# Altium footprint library General_Lib.PcbLib: 729 footprints (part 21 of 46)
Each footprint in its own frame and in the unit in brackets; x right, y up, seen from the top. Pads: shape width x height; smd on the part's side, far side on the other; paste and mask are expansions set on the pad; w line width, h text height; cw(c..) or ccw(c..) is an arc to the next point about the centre after c.
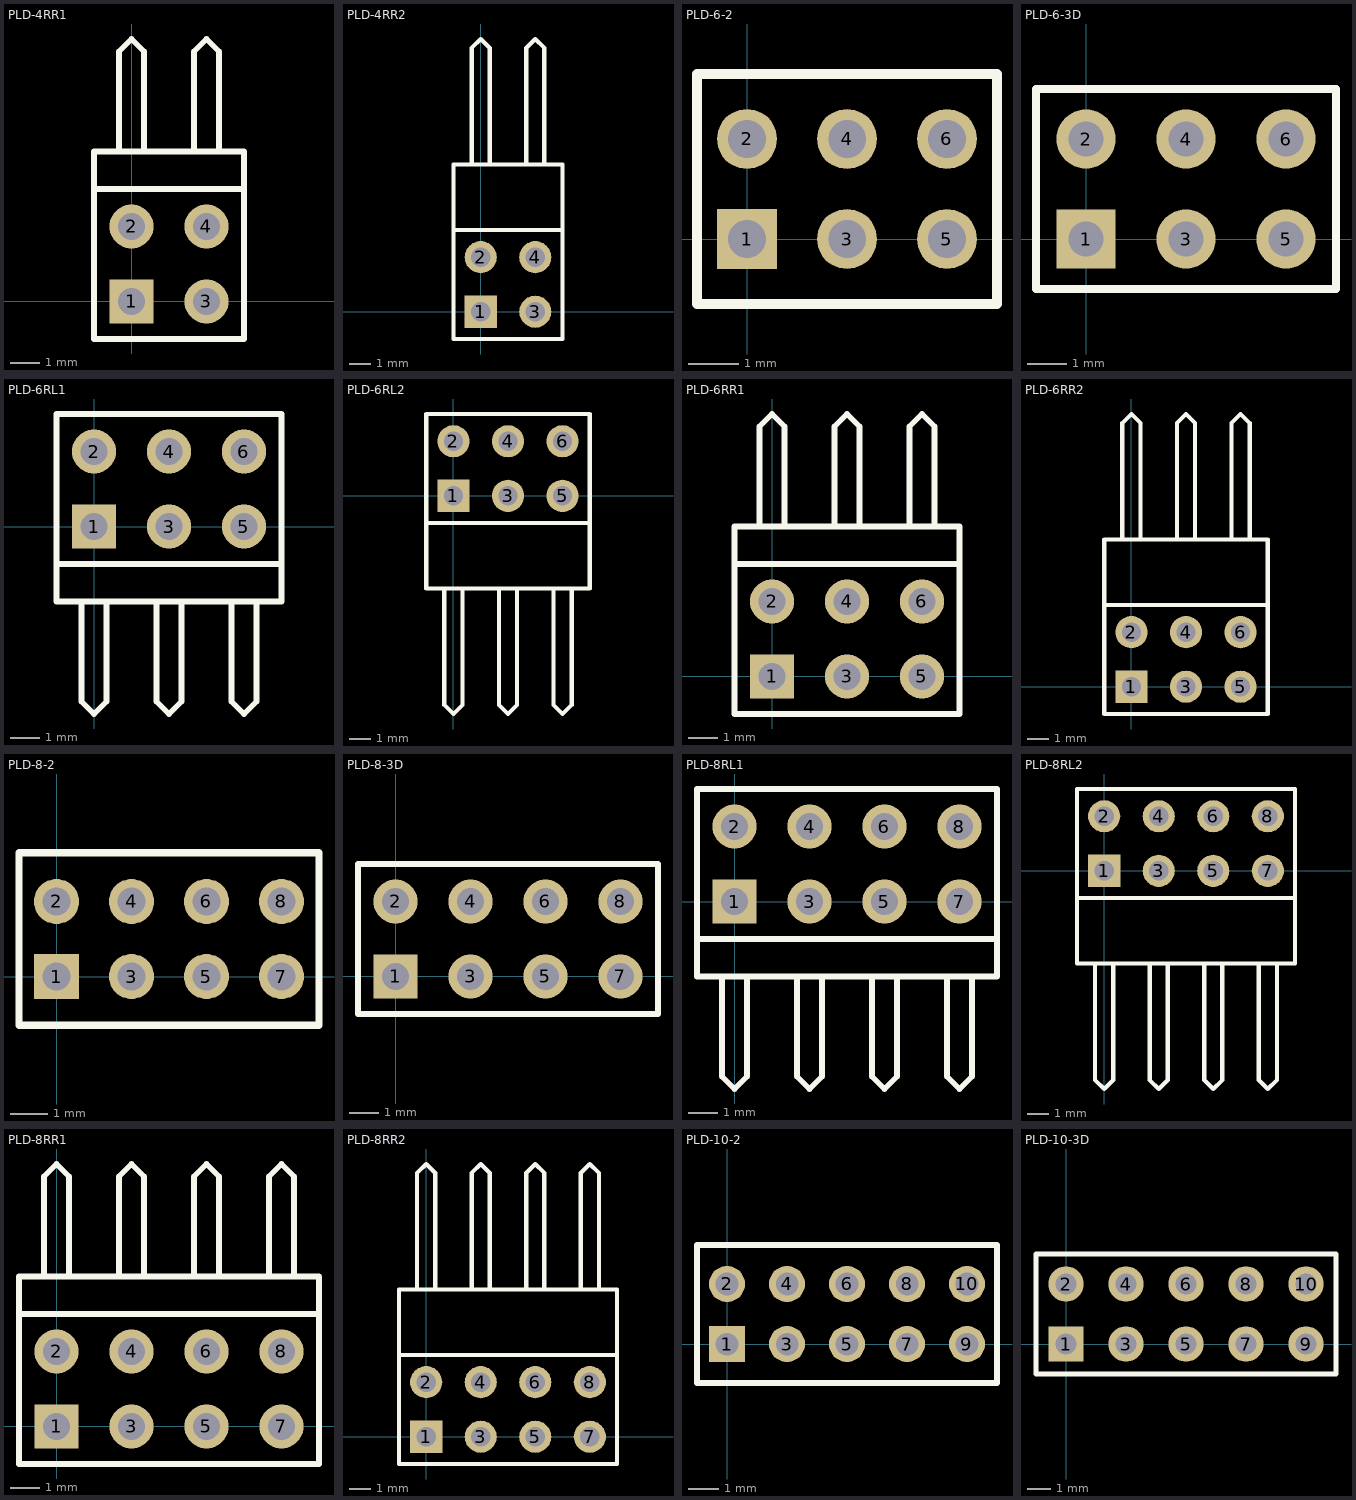
[diagram p20: the footprints below, top view; thin cyan lines are the x and y axes]

## PLD-4RR1 [mm] "Connector; Header; 2x2 Position"
height 7
pads (4):
  rect 1.5x1.5 hole 0.9: 1(0,0)
  round 1.5 hole 0.9: 2(0,2.54) 3(2.54,0) 4(2.54,2.54)
Top Overlay:
  lines w0.2: -0.423,5.08 -0.423,8.467 0,8.89 0.423,8.467 0.423,5.08 ; 2.117,5.08 2.117,8.467 2.54,8.89 2.963,8.467 2.963,5.08 ; -1.27,3.81 -1.27,-1.27 3.81,-1.27 3.81,3.81 ; -1.27,3.81 3.81,3.81 ; -1.27,3.81 -1.27,5.08 3.81,5.08 3.81,3.81
3D body "PLS-1R.step": height 5.45, standoff -3, extent -1.27,1.27 1.27,9.89
3D body "PLS-1Rr.stp": height 7.99, standoff -3, extent -1.27,-1.27 1.27,9.89
3D body "PLS-1Rr.stp": height 7.99, standoff -3, extent 1.27,-1.27 3.81,9.89
3D body "PLS-1R.step": height 5.45, standoff -3, extent 1.27,1.27 3.81,9.89

## PLD-4RR2 [mm] "Connector; Header; 2x2 Position"
height 5
pads (4):
  rect 1.5x1.5 hole 0.9: 1(0,0)
  round 1.5 hole 0.9: 2(0,2.54) 3(2.54,0) 4(2.54,2.54)
Top Overlay:
  lines w0.2: -0.423,6.858 -0.423,12.277 0,12.7 0.423,12.277 0.423,6.858 ; 2.117,6.858 2.117,12.277 2.54,12.7 2.963,12.277 2.963,6.858 ; -1.27,3.81 -1.27,6.858 3.81,6.858 3.81,3.81 ; -1.27,3.81 3.81,3.81 ; -1.27,3.81 -1.27,-1.27 3.81,-1.27 3.81,3.81
3D body "PLD-R2.stp": height 5.08, standoff -2.6, extent 1.27,-0.324 3.81,12.516
3D body "PLD-R2.stp": height 5.08, standoff -2.6, extent -1.27,-0.324 1.27,12.516

## PLD-6-2 [mm] "Connector; Header; 3x2 Position"
height 6
pads (6):
  rect 1.2x1.2 hole 0.75: 1(0,0)
  round 1.2 hole 0.75: 2(0,2) 3(2,0) 4(2,2) 5(4,0) 6(4,2)
Top Overlay:
  lines w0.2: -1,-1.3 5,-1.3 5,3.3 -1,3.3 -1,-1.3
3D body "pld-2mm.stp": height 5.5, standoff -2.5, extent -1,-1.3 1,3.3
3D body "pld-2mm.stp": height 5.5, standoff -2.5, extent 1,-1.3 3,3.3
3D body "pld-2mm.stp": height 5.5, standoff -2.5, extent 3,-1.3 5,3.3

## PLD-6-3D [mm] "Connector; Header; 3x2 Position"
height 7.5
pads (6):
  rect 1.5x1.5 hole 0.9: 1(0,0)
  round 1.5 hole 0.9: 2(0,2.54) 3(2.54,0) 4(2.54,2.54) 5(5.08,0) 6(5.08,2.54)
Top Overlay:
  lines w0.2: 1.482,-1.27 6.35,-1.27 ; 6.35,-1.27 6.35,3.81 -1.27,3.81 -1.27,-1.27 6.35,-1.27
3D body "PLD-6.step": height 8.4, standoff -3, extent -1.27,-1.23 6.35,3.77

## PLD-6RL1 [mm] "Connector; Header; 3x2 Position"
height 7
pads (6):
  rect 1.5x1.5 hole 0.9: 1(0,0)
  round 1.5 hole 0.9: 2(0,2.54) 3(2.54,0) 4(2.54,2.54) 5(5.08,0) 6(5.08,2.54)
Top Overlay:
  lines w0.2: -0.423,-2.54 -0.423,-5.927 0,-6.35 0.423,-5.927 0.423,-2.54 ; 2.117,-2.54 2.117,-5.927 2.54,-6.35 2.963,-5.927 2.963,-2.54 ; 4.657,-2.54 4.657,-5.927 5.08,-6.35 5.503,-5.927 5.503,-2.54 ; -1.27,-1.27 6.35,-1.27 ; -1.27,-1.27 -1.27,3.81 6.35,3.81 6.35,-1.27 ; -1.27,-1.27 -1.27,-2.54 6.35,-2.54 6.35,-1.27
3D body "PLS-1Rr.stp": height 7.99, standoff -3, extent -1.27,-7.35 1.27,3.81
3D body "PLS-1R.step": height 5.45, standoff -3, extent -1.27,-7.35 1.27,1.27
3D body "PLS-1R.step": height 5.45, standoff -3, extent 1.27,-7.35 3.81,1.27
3D body "PLS-1Rr.stp": height 7.99, standoff -3, extent 1.27,-7.35 3.81,3.81
3D body "PLS-1Rr.stp": height 7.99, standoff -3, extent 3.81,-7.35 6.35,3.81
3D body "PLS-1R.step": height 5.45, standoff -3, extent 3.81,-7.35 6.35,1.27

## PLD-6RL2 [mm] "Connector; Header; 3x2 Position"
height 5
pads (6):
  rect 1.5x1.5 hole 0.9: 1(0,0)
  round 1.5 hole 0.9: 2(0,2.54) 3(2.54,0) 4(2.54,2.54) 5(5.08,0) 6(5.08,2.54)
Top Overlay:
  lines w0.2: -0.423,-4.318 -0.423,-9.737 0,-10.16 0.423,-9.737 0.423,-4.318 ; 2.117,-4.318 2.117,-9.737 2.54,-10.16 2.963,-9.737 2.963,-4.318 ; 4.657,-4.318 4.657,-9.737 5.08,-10.16 5.503,-9.737 5.503,-4.318 ; -1.27,-1.27 6.35,-1.27 ; -1.27,-1.27 -1.27,3.81 6.35,3.81 6.35,-1.27 ; -1.27,-1.27 -1.27,-4.318 6.35,-4.318 6.35,-1.27
3D body "PLD-R2.stp": height 5.08, standoff -2.6, extent -1.27,-9.976 1.27,2.864
3D body "PLD-R2.stp": height 5.08, standoff -2.6, extent 1.27,-9.976 3.81,2.864
3D body "PLD-R2.stp": height 5.08, standoff -2.6, extent 3.81,-9.976 6.35,2.864

## PLD-6RR1 [mm] "Connector; Header; 3x2 Position"
height 7
pads (6):
  rect 1.5x1.5 hole 0.9: 1(0,0)
  round 1.5 hole 0.9: 2(0,2.54) 3(2.54,0) 4(2.54,2.54) 5(5.08,0) 6(5.08,2.54)
Top Overlay:
  lines w0.2: -0.423,5.08 -0.423,8.467 0,8.89 0.423,8.467 0.423,5.08 ; 2.117,5.08 2.117,8.467 2.54,8.89 2.963,8.467 2.963,5.08 ; 4.657,5.08 4.657,8.467 5.08,8.89 5.503,8.467 5.503,5.08 ; -1.27,3.81 6.35,3.81 ; -1.27,3.81 -1.27,-1.27 6.35,-1.27 6.35,3.81 ; -1.27,3.81 -1.27,5.08 6.35,5.08 6.35,3.81
3D body "PLS-1Rr.stp": height 7.99, standoff -3, extent 3.81,-1.27 6.35,9.89
3D body "PLS-1R.step": height 5.45, standoff -3, extent 3.81,1.27 6.35,9.89
3D body "PLS-1R.step": height 5.45, standoff -3, extent 1.27,1.27 3.81,9.89
3D body "PLS-1Rr.stp": height 7.99, standoff -3, extent 1.27,-1.27 3.81,9.89
3D body "PLS-1Rr.stp": height 7.99, standoff -3, extent -1.27,-1.27 1.27,9.89
3D body "PLS-1R.step": height 5.45, standoff -3, extent -1.27,1.27 1.27,9.89

## PLD-6RR2 [mm] "Connector; Header; 3x2 Position"
height 5
pads (6):
  rect 1.5x1.5 hole 0.9: 1(0,0)
  round 1.5 hole 0.9: 2(0,2.54) 3(2.54,0) 4(2.54,2.54) 5(5.08,0) 6(5.08,2.54)
Top Overlay:
  lines w0.2: -0.423,6.858 -0.423,12.277 0,12.7 0.423,12.277 0.423,6.858 ; 2.117,6.858 2.117,12.277 2.54,12.7 2.963,12.277 2.963,6.858 ; 4.657,6.858 4.657,12.277 5.08,12.7 5.503,12.277 5.503,6.858 ; -1.27,3.81 6.35,3.81 ; -1.27,3.81 -1.27,6.858 6.35,6.858 6.35,3.81 ; -1.27,3.81 -1.27,-1.27 6.35,-1.27 6.35,3.81
3D body "PLD-R2.stp": height 5.08, standoff -2.6, extent 3.81,-0.324 6.35,12.516
3D body "PLD-R2.stp": height 5.08, standoff -2.6, extent 1.27,-0.324 3.81,12.516
3D body "PLD-R2.stp": height 5.08, standoff -2.6, extent -1.27,-0.324 1.27,12.516

## PLD-8-2 [mm] "Connector; Header; 4x2 Position"
height 6
pads (8):
  rect 1.2x1.2 hole 0.75: 1(0,0)
  round 1.2 hole 0.75: 2(0,2) 3(2,0) 4(2,2) 5(4,0) 6(4,2) 7(6,0) 8(6,2)
Top Overlay:
  lines w0.2: -1,-1.3 -1,3.3 7,3.3 7,-1.3 -1,-1.3
3D body "pld-2mm.stp": height 5.5, standoff -2.5, extent 5,-1.3 7,3.3
3D body "pld-2mm.stp": height 5.5, standoff -2.5, extent 3,-1.3 5,3.3
3D body "pld-2mm.stp": height 5.5, standoff -2.5, extent 1,-1.3 3,3.3
3D body "pld-2mm.stp": height 5.5, standoff -2.5, extent -1,-1.3 1,3.3

## PLD-8-3D [mm] "Connector; Header; 4x2 Position"
height 7.5
pads (8):
  rect 1.5x1.5 hole 0.9: 1(0,0)
  round 1.5 hole 0.9: 2(0,2.54) 3(2.54,0) 4(2.54,2.54) 5(5.08,0) 6(5.08,2.54) 7(7.62,0) 8(7.62,2.54)
Top Overlay:
  lines w0.2: -1.27,-1.27 8.89,-1.27 8.89,3.81 -1.27,3.81 -1.27,-1.27
3D body "PLD-08.step": height 8.4, standoff -3, extent -1.27,-1.23 8.89,3.77

## PLD-8RL1 [mm] "Connector; Header; 4x2 Position"
height 7
pads (8):
  rect 1.5x1.5 hole 0.9: 1(0,0)
  round 1.5 hole 0.9: 2(0,2.54) 3(2.54,0) 4(2.54,2.54) 5(5.08,0) 6(5.08,2.54) 7(7.62,0) 8(7.62,2.54)
Top Overlay:
  lines w0.2: -0.423,-2.54 -0.423,-5.927 0,-6.35 0.423,-5.927 0.423,-2.54 ; 2.117,-2.54 2.117,-5.927 2.54,-6.35 2.963,-5.927 2.963,-2.54 ; 4.657,-2.54 4.657,-5.927 5.08,-6.35 5.503,-5.927 5.503,-2.54 ; 7.197,-2.54 7.197,-5.927 7.62,-6.35 8.043,-5.927 8.043,-2.54 ; -1.27,-1.27 -1.27,-2.54 8.89,-2.54 8.89,-1.27 ; -1.27,-1.27 -1.27,3.81 8.89,3.81 8.89,-1.27 ; -1.27,-1.27 8.89,-1.27
3D body "PLS-1R.step": height 5.45, standoff -3, extent 3.81,-7.35 6.35,1.27
3D body "PLS-1Rr.stp": height 7.99, standoff -3, extent 3.81,-7.35 6.35,3.81
3D body "PLS-1Rr.stp": height 7.99, standoff -3, extent 6.35,-7.35 8.89,3.81
3D body "PLS-1R.step": height 5.45, standoff -3, extent 6.35,-7.35 8.89,1.27
3D body "PLS-1R.step": height 5.45, standoff -3, extent -1.27,-7.35 1.27,1.27
3D body "PLS-1Rr.stp": height 7.99, standoff -3, extent -1.27,-7.35 1.27,3.81
3D body "PLS-1Rr.stp": height 7.99, standoff -3, extent 1.27,-7.35 3.81,3.81
3D body "PLS-1R.step": height 5.45, standoff -3, extent 1.27,-7.35 3.81,1.27

## PLD-8RL2 [mm] "Connector; Header; 4x2 Position"
height 5
pads (8):
  rect 1.5x1.5 hole 0.9: 1(0,0)
  round 1.5 hole 0.9: 2(0,2.54) 3(2.54,0) 4(2.54,2.54) 5(5.08,0) 6(5.08,2.54) 7(7.62,0) 8(7.62,2.54)
Top Overlay:
  lines w0.2: -0.423,-4.318 -0.423,-9.737 0,-10.16 0.423,-9.737 0.423,-4.318 ; 2.117,-4.318 2.117,-9.737 2.54,-10.16 2.963,-9.737 2.963,-4.318 ; 4.657,-4.318 4.657,-9.737 5.08,-10.16 5.503,-9.737 5.503,-4.318 ; 7.197,-4.318 7.197,-9.737 7.62,-10.16 8.043,-9.737 8.043,-4.318 ; 8.89,-1.27 -1.27,-1.27 ; -1.27,-1.27 -1.27,3.81 8.89,3.81 8.89,-4.318 -1.27,-4.318 -1.27,-1.27
3D body "PLD-R2.stp": height 5.08, standoff -2.6, extent 1.27,-9.976 3.81,2.864
3D body "PLD-R2.stp": height 5.08, standoff -2.6, extent -1.27,-9.976 1.27,2.864
3D body "PLD-R2.stp": height 5.08, standoff -2.6, extent 6.35,-9.976 8.89,2.864
3D body "PLD-R2.stp": height 5.08, standoff -2.6, extent 3.81,-9.976 6.35,2.864

## PLD-8RR1 [mm] "Connector; Header; 4x2 Position"
height 7
pads (8):
  rect 1.5x1.5 hole 0.9: 1(0,0)
  round 1.5 hole 0.9: 2(0,2.54) 3(2.54,0) 4(2.54,2.54) 5(5.08,0) 6(5.08,2.54) 7(7.62,0) 8(7.62,2.54)
Top Overlay:
  lines w0.2: -0.423,5.08 -0.423,8.467 0,8.89 0.423,8.467 0.423,5.08 ; 2.117,5.08 2.117,8.467 2.54,8.89 2.963,8.467 2.963,5.08 ; 4.657,5.08 4.657,8.467 5.08,8.89 5.503,8.467 5.503,5.08 ; 7.197,5.08 7.197,8.467 7.62,8.89 8.043,8.467 8.043,5.08 ; -1.27,3.81 8.89,3.81 ; -1.27,3.81 -1.27,-1.27 8.89,-1.27 8.89,3.81 ; -1.27,3.81 -1.27,5.08 8.89,5.08 8.89,3.81
3D body "PLS-1R.step": height 5.45, standoff -3, extent 3.81,1.27 6.35,9.89
3D body "PLS-1Rr.stp": height 7.99, standoff -3, extent 3.81,-1.27 6.35,9.89
3D body "PLS-1Rr.stp": height 7.99, standoff -3, extent 6.35,-1.27 8.89,9.89
3D body "PLS-1R.step": height 5.45, standoff -3, extent 6.35,1.27 8.89,9.89
3D body "PLS-1R.step": height 5.45, standoff -3, extent -1.27,1.27 1.27,9.89
3D body "PLS-1Rr.stp": height 7.99, standoff -3, extent -1.27,-1.27 1.27,9.89
3D body "PLS-1Rr.stp": height 7.99, standoff -3, extent 1.27,-1.27 3.81,9.89
3D body "PLS-1R.step": height 5.45, standoff -3, extent 1.27,1.27 3.81,9.89

## PLD-8RR2 [mm] "Connector; Header; 4x2 Position"
height 5
pads (8):
  rect 1.5x1.5 hole 0.9: 1(0,0)
  round 1.5 hole 0.9: 2(0,2.54) 3(2.54,0) 4(2.54,2.54) 5(5.08,0) 6(5.08,2.54) 7(7.62,0) 8(7.62,2.54)
Top Overlay:
  lines w0.2: -0.423,6.858 -0.423,12.277 0,12.7 0.423,12.277 0.423,6.858 ; 2.117,6.858 2.117,12.277 2.54,12.7 2.963,12.277 2.963,6.858 ; 4.657,6.858 4.657,12.277 5.08,12.7 5.503,12.277 5.503,6.858 ; 7.197,6.858 7.197,12.277 7.62,12.7 8.043,12.277 8.043,6.858 ; 8.89,3.81 -1.27,3.81 ; -1.27,3.81 -1.27,6.858 8.89,6.858 8.89,-1.27 -1.27,-1.27 -1.27,3.81
3D body "PLD-R2.stp": height 5.08, standoff -2.6, extent 3.81,-0.324 6.35,12.516
3D body "PLD-R2.stp": height 5.08, standoff -2.6, extent 6.35,-0.324 8.89,12.516
3D body "PLD-R2.stp": height 5.08, standoff -2.6, extent -1.27,-0.324 1.27,12.516
3D body "PLD-R2.stp": height 5.08, standoff -2.6, extent 1.27,-0.324 3.81,12.516

## PLD-10-2 [mm] "Connector; Header; 5x2 Position"
height 6
pads (10):
  rect 1.2x1.2 hole 0.75: 1(0,0)
  round 1.2 hole 0.75: 2(0,2) 3(2,0) 4(2,2) 5(4,0) 6(4,2) 7(6,0) 8(6,2) 9(8,0) 10(8,2)
Top Overlay:
  lines w0.2: -1,-1.3 9,-1.3 9,3.3 -1,3.3 -1,-1.3
3D body "pld-2mm.stp": height 5.5, standoff -2.5, extent -1,-1.3 1,3.3
3D body "pld-2mm.stp": height 5.5, standoff -2.5, extent 1,-1.3 3,3.3
3D body "pld-2mm.stp": height 5.5, standoff -2.5, extent 3,-1.3 5,3.3
3D body "pld-2mm.stp": height 5.5, standoff -2.5, extent 5,-1.3 7,3.3
3D body "pld-2mm.stp": height 5.5, standoff -2.5, extent 7,-1.3 9,3.3

## PLD-10-3D [mm] "Connector; Header; 5x2 Position"
height 7.5
pads (10):
  rect 1.5x1.5 hole 0.9: 1(0,0)
  round 1.5 hole 0.9: 2(0,2.54) 3(2.54,0) 4(2.54,2.54) 5(5.08,0) 6(5.08,2.54) 7(7.62,0) 8(7.62,2.54) 9(10.16,0) 10(10.16,2.54)
Top Overlay:
  lines w0.2: -1.27,-1.27 11.43,-1.27 11.43,3.81 -1.27,3.81 -1.27,-1.27
3D body "PLD-10.step": height 8.4, standoff -3, extent -1.27,-1.23 11.43,3.77